# Altium footprint library capacitors.PcbLib: 59 footprints (part 4 of 4)
Each footprint in its own frame and in the unit in brackets; x right, y up, seen from the top. Pads: shape width x height; smd on the part's side, far side on the other; paste and mask are expansions set on the pad; w line width, h text height; cw(c..) or ccw(c..) is an arc to the next point about the centre after c.
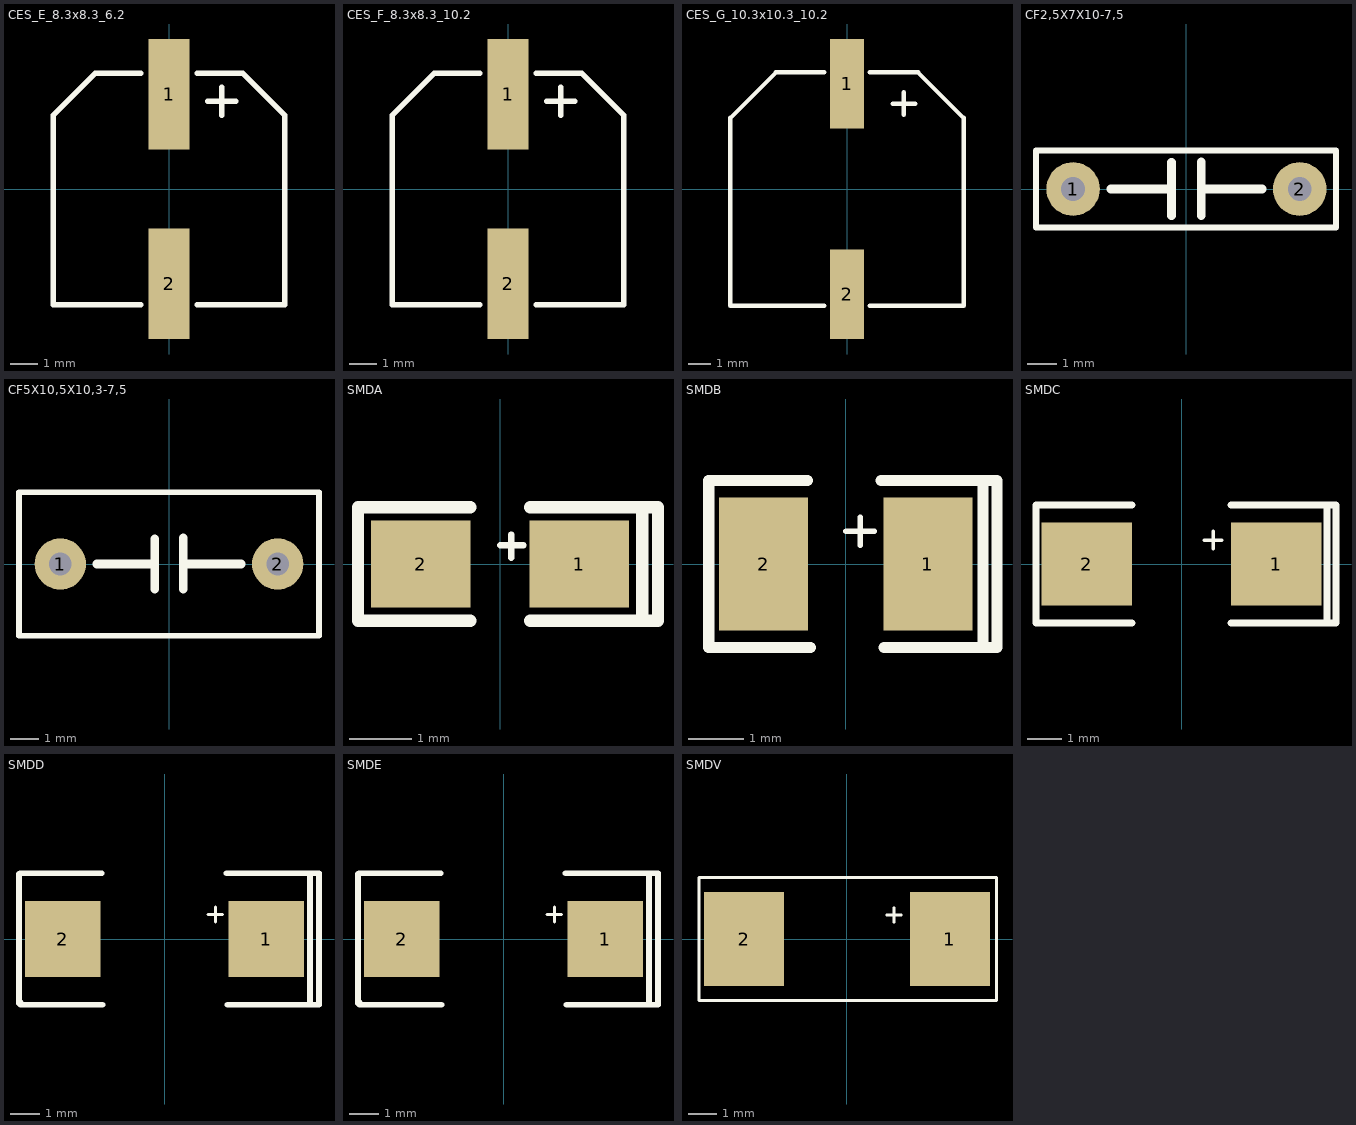
[diagram p3: the footprints below, top view; thin cyan lines are the x and y axes]

## CES_E_8.3x8.3_6.2 [mm] "SMT Aluminum Electrolytic Capacitor, E Size; base: 8.3x8.3mm, height: 6.2mm"
height 6.2
pads (2):
  rect 1.5x4 smd: 1(0,3.429) 2(0,-3.429)
Top Overlay:
  lines w0.2: -1.016,-4.191 -4.191,-4.191 -4.191,2.667 -2.667,4.191 -1.016,4.191 ; 1.016,-4.191 4.191,-4.191 4.191,2.667 2.667,4.191 1.016,4.191 ; 1.405,3.175 2.413,3.175 ; 1.905,2.675 1.905,3.683
3D body "User Library-ALU-E.STEP": height 6.2, standoff 0, extent -4.15,-4.5 4.15,4.5

## CES_F_8.3x8.3_10.2 [mm] "SMT Aluminum Electrolytic Capacitor, F Size; base: 8.3x8.3mm, height: 10.2mm"
height 10.2
pads (2):
  rect 1.5x4 smd: 1(0,3.429) 2(0,-3.429)
Top Overlay:
  lines w0.2: -1.016,-4.191 -4.191,-4.191 -4.191,2.667 -2.667,4.191 -1.016,4.191 ; 1.016,-4.191 4.191,-4.191 4.191,2.667 2.667,4.191 1.016,4.191 ; 1.405,3.175 2.413,3.175 ; 1.905,2.675 1.905,3.683
3D body "User Library-ALU-F.STEP": height 10.2, standoff 0, extent -4.15,-4.95 4.15,4.95

## CES_G_10.3x10.3_10.2 [mm] "SMT Aluminum Electrolytic Capacitor, G Size; base: 10.3x10.3mm, height: 10.2mm"
height 10.2
pads (2):
  rect 1.5x4 smd: 1(0,4.699) 2(0,-4.699)
Top Overlay:
  lines w0.2: -1.016,-5.207 -5.207,-5.207 -5.207,3.175 -3.175,5.207 -1.016,5.207 ; 1.016,-5.207 5.207,-5.207 5.207,3.175 3.175,5.207 1.016,5.207 ; 2.04,3.81 3.048,3.81 ; 2.54,3.31 2.54,4.318
3D body "User Library-ALU-G.STEP": height 10.2, standoff 0, extent -5.15,-5.8 5.15,5.8

## CF2,5X7X10-7,5 [mm] "Polyester capacitor, 2,5(W)x7(H)x10(L); WIMA MKS4"
height 7
pads (2):
  round 1.8 hole 0.8: 1(-3.81,0) 2(3.81,0)
Top Overlay:
  lines w0.2: -5.055,-1.295 5.029,-1.295 5.029,1.295 -5.055,1.295 -5.055,-1.295
  lines w0.3: -2.54,0 -0.5,0 ; -0.5,-0.889 -0.5,0.889 ; 0.5,-0.889 0.5,0.914 ; 0.5,0 2.54,0
3D body "User Library-MKS4B031502A00-MKS4-2_5x7x10x7_5.step": height 7.2, standoff -3.8, extent -5,-1.26 5,1.25

## CF5X10,5X10,3-7,5 [mm] "Polyester capacitor, 5(W)x10,5(H)x10,3(L); WIMA MKS4"
height 10
pads (2):
  round 1.8 hole 0.8: 1(-3.81,0) 2(3.81,0)
Top Overlay:
  lines w0.2: -5.258,-2.515 -5.258,2.515 5.258,2.515 5.258,-2.515 -5.258,-2.515
  lines w0.3: -2.54,0 -0.5,0 ; -0.5,-0.889 -0.5,0.889 ; 0.5,-0.889 0.5,0.914 ; 0.5,0 2.54,0
3D body: height 10.3, standoff 0, extent -5.232,-2.489 5.232,2.489

## SMDA [mm] "SMDA"
pads (2):
  rect 1.6x1.4 smd: 1(1.276,0) 2(-1.275,0)
Top Overlay:
  lines w0.102: 0.003,0.3 0.376,0.3 ; 0.178,0.102 0.178,0.475
  lines w0.2: -0.483,-0.914 -2.286,-0.914 -2.286,0.914 -0.483,0.914 ; 0.483,-0.914 2.286,-0.914 2.286,0.914 ; 0.483,0.914 2.286,0.914 ; 2.261,-0.914 2.54,-0.914 2.54,0.914 2.286,0.914
3D body "User Library-AVX_ACASE.step": height 1.71, standoff 0, extent -1.7,-0.84 1.7,0.84

## SMDB [mm] "SMDB"
pads (2):
  rect 1.6x2.4 smd: 1(1.476,0) 2(-1.475,0)
Top Overlay:
  lines w0.102: 0.003,0.589 0.511,0.589 ; 0.257,0.335 0.257,0.843
  lines w0.2: -2.464,-1.499 -2.464,-1.372 -2.464,1.372 -2.464,1.499 -0.686,1.499 ; -2.438,-1.499 -0.635,-1.499 ; 0.635,1.499 2.438,1.499 ; 0.686,-1.499 2.464,-1.499 ; 2.464,-1.499 2.718,-1.499 2.718,1.499 2.464,1.499 2.464,1.372 2.464,-1.372 2.464,-1.499
3D body "User Library-AVX_BCASE.step": height 2.03, standoff 0, extent -1.85,-1.465 1.85,1.465

## SMDC [mm] "SMDC"
pads (2):
  rect 2.6x2.4 smd: 1(2.726,0) 2(-2.725,0)
Top Overlay:
  lines w0.102: 0.653,0.689 1.161,0.689 ; 0.907,0.435 0.907,0.943
  lines w0.2: -1.422,-1.702 -4.191,-1.702 -4.191,-1.651 -4.191,1.651 -4.191,1.702 -1.422,1.702 ; 1.422,-1.702 4.191,-1.702 4.191,-1.651 4.191,1.651 4.191,1.702 1.422,1.702 ; 4.064,-1.702 4.445,-1.702 4.445,1.702 4.166,1.702
3D body "User Library-AVX_C_CASE.step": height 2.7, standoff 0, extent -3.05,-1.675 3.05,1.675

## SMDD [mm] "SMD D size tantalum capacitor"
height 5
pads (2):
  rect 2.6x2.6 smd: 1(3.5,0) 2(-3.5,0)
Top Overlay:
  lines w0.102: 1.49,0.839 1.998,0.839 ; 1.744,0.585 1.744,1.093
  lines w0.2: -5.004,-2.21 -5.004,2.235 -4.953,2.261 -2.159,2.261 ; -4.953,-2.184 -4.953,-2.261 -2.134,-2.261 ; 2.134,2.261 4.953,2.261 5.309,2.261 5.309,-2.261 4.978,-2.261 ; 2.159,-2.261 4.953,-2.261 5.004,-2.235 5.004,2.21
3D body "User Library-AVX_D_CASE.step": height 3.01, standoff 0, extent -3.7,-2.225 3.7,2.225

## SMDE [mm] "SMD E size tantalum capacitor"
height 5
pads (2):
  rect 2.6x2.6 smd: 1(3.5,0) 2(-3.5,0)
Top Overlay:
  lines w0.102: 1.49,0.839 1.998,0.839 ; 1.744,0.585 1.744,1.093
  lines w0.2: -5.004,-2.21 -5.004,2.235 -4.953,2.261 -2.159,2.261 ; -4.953,-2.184 -4.953,-2.261 -2.134,-2.261 ; 2.134,2.261 4.953,2.261 5.309,2.261 5.309,-2.261 4.978,-2.261 ; 2.159,-2.261 4.953,-2.261 5.004,-2.235 5.004,2.21
3D body "User Library-AVX_E_CASE.step": height 4.2, standoff 0, extent -3.7,-2.225 3.7,2.225

## SMDV [mm] "SMDV"
pads (2):
  rect 2.8x3.3 smd: 1(3.6,0) 2(-3.6,0)
Top Overlay:
  lines w0.102: 1.39,0.839 1.898,0.839 ; 1.644,0.585 1.644,1.093 ; -5.18,-2.159 -5.18,2.159 5.234,2.159 5.234,-1.751 5.234,-2.159 -5.18,-2.159